# Altium schematic symbol library SCHLIB.SchLib: 2608 symbols (part 12 of 20)
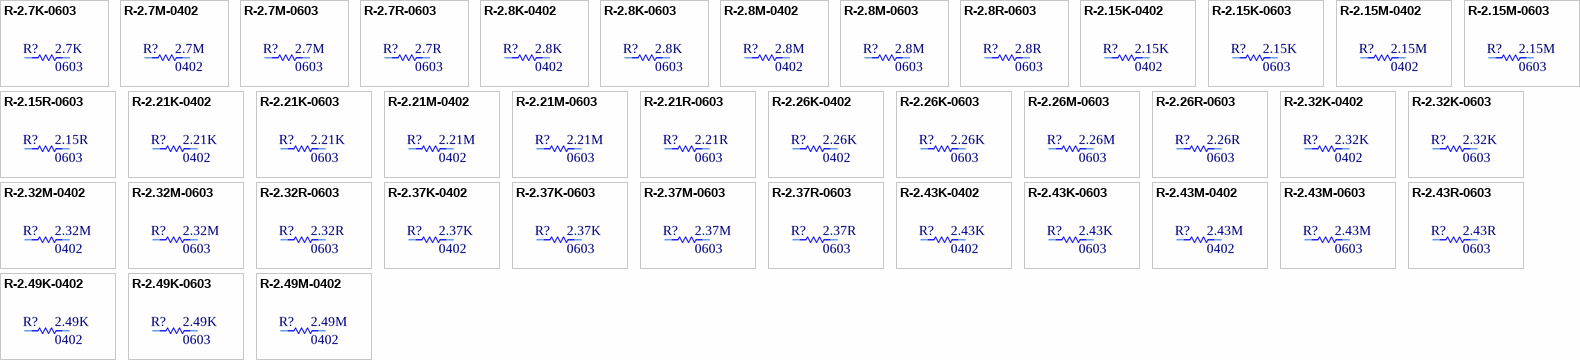
[diagram p94: symbols R-2.7K-0603 to R-2.49M-0402]

## R-2.26K-0603
designator R?, comment Package: 0603  (hidden comment: 2.26K)
RES SMD 2.26K OHM 1% 1/10W 0603; Manufacturer Part Number: CRCW06032K26FKEA; Manufacturer: Vishay Dale; Tolerance: 0.01; Power: 0.1W; Temperature Coefficient: ±100ppm/°C; Object  Type: Part; Design Item ID: R-2.26K-0603; Value: 2.26K; Composition: Thick Film; Features: Automotive AEC-Q200; Operating Temperature: -55°C ~ 155°C; Height - Seated (Max): 0.50mm; Category: Resistor
footprint R0603
pins: 1, 2

## R-2.26M-0603
designator R?, comment Package: 0603  (hidden comment: 2.26M)
RES SMD 2.26M OHM 1% 1/10W 0603; Manufacturer Part Number: CRCW06032M26FKEA; Manufacturer: Vishay Dale; Tolerance: 0.01; Power: 0.1W; Temperature Coefficient: ±100ppm/°C; Object  Type: Part; Design Item ID: R-2.26M-0603; Value: 2.26M; Composition: Thick Film; Features: Automotive AEC-Q200; Operating Temperature: -55°C ~ 155°C; Height - Seated (Max): 0.50mm; Category: Resistor
footprint R0603
pins: 1, 2

## R-2.26R-0603
designator R?, comment Package: 0603  (hidden comment: 2.26R)
RES SMD 2.26 OHM 1% 1/10W 0603; Manufacturer Part Number: CRCW06032R26FKEA; Manufacturer: Vishay Dale; Tolerance: 0.01; Power: 0.1W; Temperature Coefficient: ±100ppm/°C; Object  Type: Part; Design Item ID: R-2.26R-0603; Value: 2.26R; Composition: Thick Film; Features: Automotive AEC-Q200; Operating Temperature: -55°C ~ 155°C; Height - Seated (Max): 0.50mm; Category: Resistor
footprint R0603
pins: 1, 2

## R-2.32K-0402
designator R?, comment Package: 0402  (hidden comment: 2.32K)
RES 2.32K OHM 1% 1/16W 0402; Manufacturer Part Number: RC0402FR-072K32L; Manufacturer: YAGEO; Tolerance: 0.01; Power: 0.063W; Temperature Coefficient: ±100ppm/°C; Object  Type: Part; Design Item ID: R-2.32K-0402; Value: 2.32K; Composition: Thick Film; Features: Moisture Resistant; Operating Temperature: -55°C ~ 155°C; Height - Seated (Max): 0.40mm; Category: Resistor
footprint R0402
pins: 1, 2

## R-2.32K-0603
designator R?, comment Package: 0603  (hidden comment: 2.32K)
RES SMD 2.32K OHM 1% 1/10W 0603; Manufacturer Part Number: CRCW06032K32FKEA; Manufacturer: Vishay Dale; Tolerance: 0.01; Power: 0.1W; Temperature Coefficient: ±100ppm/°C; Object  Type: Part; Design Item ID: R-2.32K-0603; Value: 2.32K; Composition: Thick Film; Features: Automotive AEC-Q200; Operating Temperature: -55°C ~ 155°C; Height - Seated (Max): 0.50mm; Category: Resistor
footprint R0603
pins: 1, 2

## R-2.32M-0402
designator R?, comment Package: 0402  (hidden comment: 2.32M)
RES 2.32M OHM 1% 1/16W 0402; Manufacturer Part Number: RC0402FR-072M32L; Manufacturer: YAGEO; Tolerance: 0.01; Power: 0.063W; Temperature Coefficient: ±100ppm/°C; Object  Type: Part; Design Item ID: R-2.32M-0402; Value: 2.32M; Composition: Thick Film; Features: Moisture Resistant; Operating Temperature: -55°C ~ 155°C; Height - Seated (Max): 0.40mm; Category: Resistor
footprint R0402
pins: 1, 2

## R-2.32M-0603
designator R?, comment Package: 0603  (hidden comment: 2.32M)
RES SMD 2.32M OHM 1% 1/10W 0603; Manufacturer Part Number: CRCW06032M32FKEA; Manufacturer: Vishay Dale; Tolerance: 0.01; Power: 0.1W; Temperature Coefficient: ±100ppm/°C; Object  Type: Part; Design Item ID: R-2.32M-0603; Value: 2.32M; Composition: Thick Film; Features: Automotive AEC-Q200; Operating Temperature: -55°C ~ 155°C; Height - Seated (Max): 0.50mm; Category: Resistor
footprint R0603
pins: 1, 2

## R-2.32R-0603
designator R?, comment Package: 0603  (hidden comment: 2.32R)
RES SMD 2.32 OHM 1% 1/10W 0603; Manufacturer Part Number: CRCW06032R32FKEA; Manufacturer: Vishay Dale; Tolerance: 0.01; Power: 0.1W; Temperature Coefficient: ±100ppm/°C; Object  Type: Part; Design Item ID: R-2.32R-0603; Value: 2.32R; Composition: Thick Film; Features: Automotive AEC-Q200; Operating Temperature: -55°C ~ 155°C; Height - Seated (Max): 0.50mm; Category: Resistor
footprint R0603
pins: 1, 2

## R-2.37K-0402
designator R?, comment Package: 0402  (hidden comment: 2.37K)
RES 2.37K OHM 1% 1/16W 0402; Manufacturer Part Number: RC0402FR-072K37L; Manufacturer: YAGEO; Tolerance: 0.01; Power: 0.063W; Temperature Coefficient: ±100ppm/°C; Object  Type: Part; Design Item ID: R-2.37K-0402; Value: 2.37K; Composition: Thick Film; Features: Moisture Resistant; Operating Temperature: -55°C ~ 155°C; Height - Seated (Max): 0.40mm; Category: Resistor
footprint R0402
pins: 1, 2

## R-2.37K-0603
designator R?, comment Package: 0603  (hidden comment: 2.37K)
RES SMD 2.37K OHM 1% 1/10W 0603; Manufacturer Part Number: CRCW06032K37FKEA; Manufacturer: Vishay Dale; Tolerance: 0.01; Power: 0.1W; Temperature Coefficient: ±100ppm/°C; Object  Type: Part; Design Item ID: R-2.37K-0603; Value: 2.37K; Composition: Thick Film; Features: Automotive AEC-Q200; Operating Temperature: -55°C ~ 155°C; Height - Seated (Max): 0.50mm; Category: Resistor
footprint R0603
pins: 1, 2

## R-2.37M-0603
designator R?, comment Package: 0603  (hidden comment: 2.37M)
RES SMD 2.37M OHM 1% 1/10W 0603; Manufacturer Part Number: CRCW06032M37FKEA; Manufacturer: Vishay Dale; Tolerance: 0.01; Power: 0.1W; Temperature Coefficient: ±100ppm/°C; Object  Type: Part; Design Item ID: R-2.37M-0603; Value: 2.37M; Composition: Thick Film; Features: Automotive AEC-Q200; Operating Temperature: -55°C ~ 155°C; Height - Seated (Max): 0.50mm; Category: Resistor
footprint R0603
pins: 1, 2

## R-2.37R-0603
designator R?, comment Package: 0603  (hidden comment: 2.37R)
RES SMD 2.37 OHM 1% 1/10W 0603; Manufacturer Part Number: CRCW06032R37FKEA; Manufacturer: Vishay Dale; Tolerance: 0.01; Power: 0.1W; Temperature Coefficient: ±100ppm/°C; Object  Type: Part; Design Item ID: R-2.37R-0603; Value: 2.37R; Composition: Thick Film; Features: Automotive AEC-Q200; Operating Temperature: -55°C ~ 155°C; Height - Seated (Max): 0.50mm; Category: Resistor
footprint R0603
pins: 1, 2

## R-2.43K-0402
designator R?, comment Package: 0402  (hidden comment: 2.43K)
RES 2.43K OHM 1% 1/16W 0402; Manufacturer Part Number: RC0402FR-072K43L; Manufacturer: YAGEO; Tolerance: 0.01; Power: 0.063W; Temperature Coefficient: ±100ppm/°C; Object  Type: Part; Design Item ID: R-2.43K-0402; Value: 2.43K; Composition: Thick Film; Features: Moisture Resistant; Operating Temperature: -55°C ~ 155°C; Height - Seated (Max): 0.40mm; Category: Resistor
footprint R0402
pins: 1, 2

## R-2.43K-0603
designator R?, comment Package: 0603  (hidden comment: 2.43K)
RES SMD 2.43K OHM 1% 1/10W 0603; Manufacturer Part Number: CRCW06032K43FKEA; Manufacturer: Vishay Dale; Tolerance: 0.01; Power: 0.1W; Temperature Coefficient: ±100ppm/°C; Object  Type: Part; Design Item ID: R-2.43K-0603; Value: 2.43K; Composition: Thick Film; Features: Automotive AEC-Q200; Operating Temperature: -55°C ~ 155°C; Height - Seated (Max): 0.50mm; Category: Resistor
footprint R0603
pins: 1, 2

## R-2.43M-0402
designator R?, comment Package: 0402  (hidden comment: 2.43M)
RES 2.43M OHM 1% 1/16W 0402; Manufacturer Part Number: RC0402FR-072M43L; Manufacturer: YAGEO; Tolerance: 0.01; Power: 0.063W; Temperature Coefficient: ±100ppm/°C; Object  Type: Part; Design Item ID: R-2.43M-0402; Value: 2.43M; Composition: Thick Film; Features: Moisture Resistant; Operating Temperature: -55°C ~ 155°C; Height - Seated (Max): 0.40mm; Category: Resistor
footprint R0402
pins: 1, 2

## R-2.43M-0603
designator R?, comment Package: 0603  (hidden comment: 2.43M)
RES SMD 2.43M OHM 1% 1/10W 0603; Manufacturer Part Number: CRCW06032M43FKEA; Manufacturer: Vishay Dale; Tolerance: 0.01; Power: 0.1W; Temperature Coefficient: ±100ppm/°C; Object  Type: Part; Design Item ID: R-2.43M-0603; Value: 2.43M; Composition: Thick Film; Features: Automotive AEC-Q200; Operating Temperature: -55°C ~ 155°C; Height - Seated (Max): 0.50mm; Category: Resistor
footprint R0603
pins: 1, 2

## R-2.43R-0603
designator R?, comment Package: 0603  (hidden comment: 2.43R)
RES SMD 2.43 OHM 1% 1/10W 0603; Manufacturer Part Number: CRCW06032R43FKEA; Manufacturer: Vishay Dale; Tolerance: 0.01; Power: 0.1W; Temperature Coefficient: ±100ppm/°C; Object  Type: Part; Design Item ID: R-2.43R-0603; Value: 2.43R; Composition: Thick Film; Features: Automotive AEC-Q200; Operating Temperature: -55°C ~ 155°C; Height - Seated (Max): 0.50mm; Category: Resistor
footprint R0603
pins: 1, 2

## R-2.49K-0402
designator R?, comment Package: 0402  (hidden comment: 2.49K)
RES 2.49K OHM 1% 1/16W 0402; Manufacturer Part Number: RC0402FR-072K49L; Manufacturer: YAGEO; Tolerance: 0.01; Power: 0.063W; Temperature Coefficient: ±100ppm/°C; Object  Type: Part; Design Item ID: R-2.49K-0402; Value: 2.49K; Composition: Thick Film; Features: Moisture Resistant; Operating Temperature: -55°C ~ 155°C; Height - Seated (Max): 0.40mm; Category: Resistor
footprint R0402
pins: 1, 2

## R-2.49K-0603
designator R?, comment Package: 0603  (hidden comment: 2.49K)
RES SMD 2.49K OHM 1% 1/10W 0603; Manufacturer Part Number: CRCW06032K49FKEA; Manufacturer: Vishay Dale; Tolerance: 0.01; Power: 0.1W; Temperature Coefficient: ±100ppm/°C; Object  Type: Part; Design Item ID: R-2.49K-0603; Value: 2.49K; Composition: Thick Film; Features: Automotive AEC-Q200; Operating Temperature: -55°C ~ 155°C; Height - Seated (Max): 0.50mm; Category: Resistor
footprint R0603
pins: 1, 2

## R-2.49M-0402
designator R?, comment Package: 0402  (hidden comment: 2.49M)
RES 2.49M OHM 1% 1/16W 0402; Manufacturer Part Number: RC0402FR-072M49L; Manufacturer: YAGEO; Tolerance: 0.01; Power: 0.063W; Temperature Coefficient: ±100ppm/°C; Object  Type: Part; Design Item ID: R-2.49M-0402; Value: 2.49M; Composition: Thick Film; Features: Moisture Resistant; Operating Temperature: -55°C ~ 155°C; Height - Seated (Max): 0.40mm; Category: Resistor
footprint R0402
pins: 1, 2

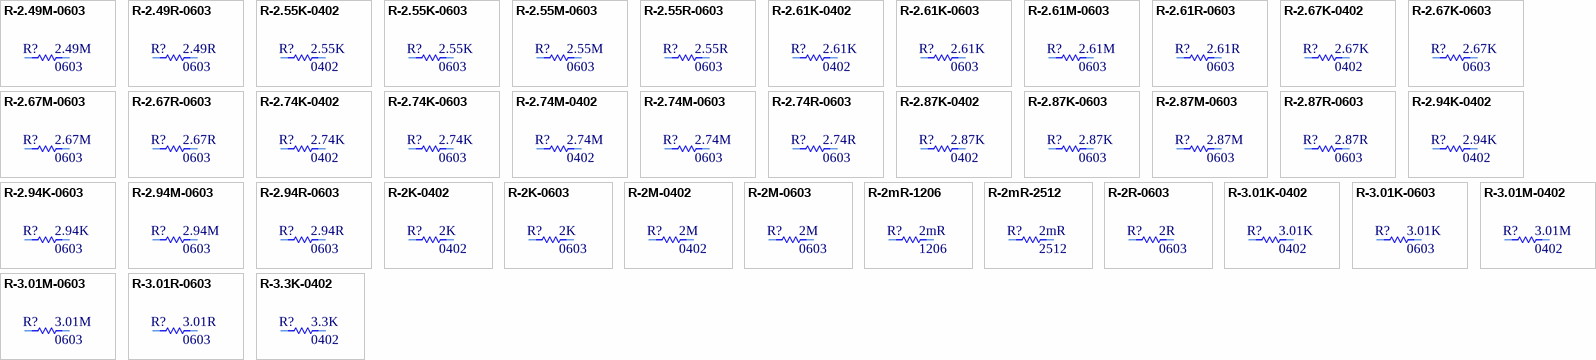
[diagram p49: symbols R-2.49M-0603 to R-3.3K-0402]

## R-2.49M-0603
designator R?, comment Package: 0603  (hidden comment: 2.49M)
RES SMD 2.49M OHM 1% 1/10W 0603; Manufacturer Part Number: CRCW06032M49FKEA; Manufacturer: Vishay Dale; Tolerance: 0.01; Power: 0.1W; Temperature Coefficient: ±100ppm/°C; Object  Type: Part; Design Item ID: R-2.49M-0603; Value: 2.49M; Composition: Thick Film; Features: Automotive AEC-Q200; Operating Temperature: -55°C ~ 155°C; Height - Seated (Max): 0.50mm; Category: Resistor
footprint R0603
pins: 1, 2

## R-2.49R-0603
designator R?, comment Package: 0603  (hidden comment: 2.49R)
RES SMD 2.49 OHM 1% 1/10W 0603; Manufacturer Part Number: CRCW06032R49FKEA; Manufacturer: Vishay Dale; Tolerance: 0.01; Power: 0.1W; Temperature Coefficient: ±100ppm/°C; Object  Type: Part; Design Item ID: R-2.49R-0603; Value: 2.49R; Composition: Thick Film; Features: Automotive AEC-Q200; Operating Temperature: -55°C ~ 155°C; Height - Seated (Max): 0.50mm; Category: Resistor
footprint R0603
pins: 1, 2

## R-2.55K-0402
designator R?, comment Package: 0402  (hidden comment: 2.55K)
RES 2.55K OHM 1% 1/16W 0402; Manufacturer Part Number: RC0402FR-072K55L; Manufacturer: YAGEO; Tolerance: 0.01; Power: 0.063W; Temperature Coefficient: ±100ppm/°C; Object  Type: Part; Design Item ID: R-2.55K-0402; Value: 2.55K; Composition: Thick Film; Features: Moisture Resistant; Operating Temperature: -55°C ~ 155°C; Height - Seated (Max): 0.40mm; Category: Resistor
footprint R0402
pins: 1, 2

## R-2.55K-0603
designator R?, comment Package: 0603  (hidden comment: 2.55K)
RES SMD 2.55K OHM 1% 1/10W 0603; Manufacturer Part Number: CRCW06032K55FKEA; Manufacturer: Vishay Dale; Tolerance: 0.01; Power: 0.1W; Temperature Coefficient: ±100ppm/°C; Object  Type: Part; Design Item ID: R-2.55K-0603; Value: 2.55K; Composition: Thick Film; Features: Automotive AEC-Q200; Operating Temperature: -55°C ~ 155°C; Height - Seated (Max): 0.50mm; Category: Resistor
footprint R0603
pins: 1, 2

## R-2.55M-0603
designator R?, comment Package: 0603  (hidden comment: 2.55M)
RES SMD 2.55M OHM 1% 1/10W 0603; Manufacturer Part Number: CRCW06032M55FKEA; Manufacturer: Vishay Dale; Tolerance: 0.01; Power: 0.1W; Temperature Coefficient: ±100ppm/°C; Object  Type: Part; Design Item ID: R-2.55M-0603; Value: 2.55M; Composition: Thick Film; Features: Automotive AEC-Q200; Operating Temperature: -55°C ~ 155°C; Height - Seated (Max): 0.50mm; Category: Resistor
footprint R0603
pins: 1, 2

## R-2.55R-0603
designator R?, comment Package: 0603  (hidden comment: 2.55R)
RES SMD 2.55 OHM 1% 1/10W 0603; Manufacturer Part Number: CRCW06032R55FKEA; Manufacturer: Vishay Dale; Tolerance: 0.01; Power: 0.1W; Temperature Coefficient: ±100ppm/°C; Object  Type: Part; Design Item ID: R-2.55R-0603; Value: 2.55R; Composition: Thick Film; Features: Automotive AEC-Q200; Operating Temperature: -55°C ~ 155°C; Height - Seated (Max): 0.50mm; Category: Resistor
footprint R0603
pins: 1, 2

## R-2.61K-0402
designator R?, comment Package: 0402  (hidden comment: 2.61K)
RES 2.61K OHM 1% 1/16W 0402; Manufacturer Part Number: RC0402FR-072K61L; Manufacturer: YAGEO; Tolerance: 0.01; Power: 0.063W; Temperature Coefficient: ±100ppm/°C; Object  Type: Part; Design Item ID: R-2.61K-0402; Value: 2.61K; Composition: Thick Film; Features: Moisture Resistant; Operating Temperature: -55°C ~ 155°C; Height - Seated (Max): 0.40mm; Category: Resistor
footprint R0402
pins: 1, 2

## R-2.61K-0603
designator R?, comment Package: 0603  (hidden comment: 2.61K)
RES SMD 2.61K OHM 1% 1/10W 0603; Manufacturer Part Number: CRCW06032K61FKEA; Manufacturer: Vishay Dale; Tolerance: 0.01; Power: 0.1W; Temperature Coefficient: ±100ppm/°C; Object  Type: Part; Design Item ID: R-2.61K-0603; Value: 2.61K; Composition: Thick Film; Features: Automotive AEC-Q200; Operating Temperature: -55°C ~ 155°C; Height - Seated (Max): 0.50mm; Category: Resistor
footprint R0603
pins: 1, 2

## R-2.61M-0603
designator R?, comment Package: 0603  (hidden comment: 2.61M)
RES SMD 2.61M OHM 1% 1/10W 0603; Manufacturer Part Number: CRCW06032M61FKEA; Manufacturer: Vishay Dale; Tolerance: 0.01; Power: 0.1W; Temperature Coefficient: ±100ppm/°C; Object  Type: Part; Design Item ID: R-2.61M-0603; Value: 2.61M; Composition: Thick Film; Features: Automotive AEC-Q200; Operating Temperature: -55°C ~ 155°C; Height - Seated (Max): 0.50mm; Category: Resistor
footprint R0603
pins: 1, 2

## R-2.61R-0603
designator R?, comment Package: 0603  (hidden comment: 2.61R)
RES SMD 2.61 OHM 1% 1/10W 0603; Manufacturer Part Number: CRCW06032R61FKEA; Manufacturer: Vishay Dale; Tolerance: 0.01; Power: 0.1W; Temperature Coefficient: ±100ppm/°C; Object  Type: Part; Design Item ID: R-2.61R-0603; Value: 2.61R; Composition: Thick Film; Features: Automotive AEC-Q200; Operating Temperature: -55°C ~ 155°C; Height - Seated (Max): 0.50mm; Category: Resistor
footprint R0603
pins: 1, 2

## R-2.67K-0402
designator R?, comment Package: 0402  (hidden comment: 2.67K)
RES 2.67K OHM 1% 1/16W 0402; Manufacturer Part Number: RC0402FR-072K67L; Manufacturer: YAGEO; Tolerance: 0.01; Power: 0.063W; Temperature Coefficient: ±100ppm/°C; Object  Type: Part; Design Item ID: R-2.67K-0402; Value: 2.67K; Composition: Thick Film; Features: Moisture Resistant; Operating Temperature: -55°C ~ 155°C; Height - Seated (Max): 0.40mm; Category: Resistor
footprint R0402
pins: 1, 2

## R-2.67K-0603
designator R?, comment Package: 0603  (hidden comment: 2.67K)
RES SMD 2.67K OHM 1% 1/10W 0603; Manufacturer Part Number: CRCW06032K67FKEA; Manufacturer: Vishay Dale; Tolerance: 0.01; Power: 0.1W; Temperature Coefficient: ±100ppm/°C; Object  Type: Part; Design Item ID: R-2.67K-0603; Value: 2.67K; Composition: Thick Film; Features: Automotive AEC-Q200; Operating Temperature: -55°C ~ 155°C; Height - Seated (Max): 0.50mm; Category: Resistor
footprint R0603
pins: 1, 2

## R-2.67M-0603
designator R?, comment Package: 0603  (hidden comment: 2.67M)
RES SMD 2.67M OHM 1% 1/10W 0603; Manufacturer Part Number: CRCW06032M67FKEA; Manufacturer: Vishay Dale; Tolerance: 0.01; Power: 0.1W; Temperature Coefficient: ±100ppm/°C; Object  Type: Part; Design Item ID: R-2.67M-0603; Value: 2.67M; Composition: Thick Film; Features: Automotive AEC-Q200; Operating Temperature: -55°C ~ 155°C; Height - Seated (Max): 0.50mm; Category: Resistor
footprint R0603
pins: 1, 2

## R-2.67R-0603
designator R?, comment Package: 0603  (hidden comment: 2.67R)
RES SMD 2.67 OHM 1% 1/10W 0603; Manufacturer Part Number: CRCW06032R67FKEA; Manufacturer: Vishay Dale; Tolerance: 0.01; Power: 0.1W; Temperature Coefficient: ±100ppm/°C; Object  Type: Part; Design Item ID: R-2.67R-0603; Value: 2.67R; Composition: Thick Film; Features: Automotive AEC-Q200; Operating Temperature: -55°C ~ 155°C; Height - Seated (Max): 0.50mm; Category: Resistor
footprint R0603
pins: 1, 2

## R-2.74K-0402
designator R?, comment Package: 0402  (hidden comment: 2.74K)
RES 2.74K OHM 1% 1/16W 0402; Manufacturer Part Number: RC0402FR-072K74L; Manufacturer: YAGEO; Tolerance: 0.01; Power: 0.063W; Temperature Coefficient: ±100ppm/°C; Object  Type: Part; Design Item ID: R-2.74K-0402; Value: 2.74K; Composition: Thick Film; Features: Moisture Resistant; Operating Temperature: -55°C ~ 155°C; Height - Seated (Max): 0.40mm; Category: Resistor
footprint R0402
pins: 1, 2

## R-2.74K-0603
designator R?, comment Package: 0603  (hidden comment: 2.74K)
RES SMD 2.74K OHM 1% 1/10W 0603; Manufacturer Part Number: CRCW06032K74FKEA; Manufacturer: Vishay Dale; Tolerance: 0.01; Power: 0.1W; Temperature Coefficient: ±100ppm/°C; Object  Type: Part; Design Item ID: R-2.74K-0603; Value: 2.74K; Composition: Thick Film; Features: Automotive AEC-Q200; Operating Temperature: -55°C ~ 155°C; Height - Seated (Max): 0.50mm; Category: Resistor
footprint R0603
pins: 1, 2

## R-2.74M-0402
designator R?, comment Package: 0402  (hidden comment: 2.74M)
RES 2.74M OHM 1% 1/16W 0402; Manufacturer Part Number: RC0402FR-072M74L; Manufacturer: YAGEO; Tolerance: 0.01; Power: 0.063W; Temperature Coefficient: ±100ppm/°C; Object  Type: Part; Design Item ID: R-2.74M-0402; Value: 2.74M; Composition: Thick Film; Features: Moisture Resistant; Operating Temperature: -55°C ~ 155°C; Height - Seated (Max): 0.40mm; Category: Resistor
footprint R0402
pins: 1, 2

## R-2.74M-0603
designator R?, comment Package: 0603  (hidden comment: 2.74M)
RES SMD 2.74M OHM 1% 1/10W 0603; Manufacturer Part Number: CRCW06032M74FKEA; Manufacturer: Vishay Dale; Tolerance: 0.01; Power: 0.1W; Temperature Coefficient: ±100ppm/°C; Object  Type: Part; Design Item ID: R-2.74M-0603; Value: 2.74M; Composition: Thick Film; Features: Automotive AEC-Q200; Operating Temperature: -55°C ~ 155°C; Height - Seated (Max): 0.50mm; Category: Resistor
footprint R0603
pins: 1, 2

## R-2.74R-0603
designator R?, comment Package: 0603  (hidden comment: 2.74R)
RES SMD 2.74 OHM 1% 1/10W 0603; Manufacturer Part Number: CRCW06032R74FKEA; Manufacturer: Vishay Dale; Tolerance: 0.01; Power: 0.1W; Temperature Coefficient: ±100ppm/°C; Object  Type: Part; Design Item ID: R-2.74R-0603; Value: 2.74R; Composition: Thick Film; Features: Automotive AEC-Q200; Operating Temperature: -55°C ~ 155°C; Height - Seated (Max): 0.50mm; Category: Resistor
footprint R0603
pins: 1, 2

## R-2.87K-0402
designator R?, comment Package: 0402  (hidden comment: 2.87K)
RES 2.87K OHM 1% 1/16W 0402; Manufacturer Part Number: RC0402FR-072K87L; Manufacturer: YAGEO; Tolerance: 0.01; Power: 0.063W; Temperature Coefficient: ±100ppm/°C; Object  Type: Part; Design Item ID: R-2.87K-0402; Value: 2.87K; Composition: Thick Film; Features: Moisture Resistant; Operating Temperature: -55°C ~ 155°C; Height - Seated (Max): 0.40mm; Category: Resistor
footprint R0402
pins: 1, 2

## R-2.87K-0603
designator R?, comment Package: 0603  (hidden comment: 2.87K)
RES SMD 2.87K OHM 1% 1/10W 0603; Manufacturer Part Number: CRCW06032K87FKEA; Manufacturer: Vishay Dale; Tolerance: 0.01; Power: 0.1W; Temperature Coefficient: ±100ppm/°C; Object  Type: Part; Design Item ID: R-2.87K-0603; Value: 2.87K; Composition: Thick Film; Features: Automotive AEC-Q200; Operating Temperature: -55°C ~ 155°C; Height - Seated (Max): 0.50mm; Category: Resistor
footprint R0603
pins: 1, 2

## R-2.87M-0603
designator R?, comment Package: 0603  (hidden comment: 2.87M)
RES SMD 2.87M OHM 1% 1/10W 0603; Manufacturer Part Number: CRCW06032M87FKEA; Manufacturer: Vishay Dale; Tolerance: 0.01; Power: 0.1W; Temperature Coefficient: ±100ppm/°C; Object  Type: Part; Design Item ID: R-2.87M-0603; Value: 2.87M; Composition: Thick Film; Features: Automotive AEC-Q200; Operating Temperature: -55°C ~ 155°C; Height - Seated (Max): 0.50mm; Category: Resistor
footprint R0603
pins: 1, 2

## R-2.87R-0603
designator R?, comment Package: 0603  (hidden comment: 2.87R)
RES SMD 2.87 OHM 1% 1/10W 0603; Manufacturer Part Number: CRCW06032R87FKEA; Manufacturer: Vishay Dale; Tolerance: 0.01; Power: 0.1W; Temperature Coefficient: ±100ppm/°C; Object  Type: Part; Design Item ID: R-2.87R-0603; Value: 2.87R; Composition: Thick Film; Features: Automotive AEC-Q200; Operating Temperature: -55°C ~ 155°C; Height - Seated (Max): 0.50mm; Category: Resistor
footprint R0603
pins: 1, 2

## R-2.94K-0402
designator R?, comment Package: 0402  (hidden comment: 2.94K)
RES 2.94K OHM 1% 1/16W 0402; Manufacturer Part Number: RC0402FR-072K94L; Manufacturer: YAGEO; Tolerance: 0.01; Power: 0.063W; Temperature Coefficient: ±100ppm/°C; Object  Type: Part; Design Item ID: R-2.94K-0402; Value: 2.94K; Composition: Thick Film; Features: Moisture Resistant; Operating Temperature: -55°C ~ 155°C; Height - Seated (Max): 0.40mm; Category: Resistor
footprint R0402
pins: 1, 2

## R-2.94K-0603
designator R?, comment Package: 0603  (hidden comment: 2.94K)
RES SMD 2.94K OHM 1% 1/10W 0603; Manufacturer Part Number: CRCW06032K94FKEA; Manufacturer: Vishay Dale; Tolerance: 0.01; Power: 0.1W; Temperature Coefficient: ±100ppm/°C; Object  Type: Part; Design Item ID: R-2.94K-0603; Value: 2.94K; Composition: Thick Film; Features: Automotive AEC-Q200; Operating Temperature: -55°C ~ 155°C; Height - Seated (Max): 0.50mm; Category: Resistor
footprint R0603
pins: 1, 2

## R-2.94M-0603
designator R?, comment Package: 0603  (hidden comment: 2.94M)
RES SMD 2.94M OHM 1% 1/10W 0603; Manufacturer Part Number: CRCW06032M94FKEA; Manufacturer: Vishay Dale; Tolerance: 0.01; Power: 0.1W; Temperature Coefficient: ±100ppm/°C; Object  Type: Part; Design Item ID: R-2.94M-0603; Value: 2.94M; Composition: Thick Film; Features: Automotive AEC-Q200; Operating Temperature: -55°C ~ 155°C; Height - Seated (Max): 0.50mm; Category: Resistor
footprint R0603
pins: 1, 2

## R-2.94R-0603
designator R?, comment Package: 0603  (hidden comment: 2.94R)
RES SMD 2.94 OHM 1% 1/10W 0603; Manufacturer Part Number: CRCW06032R94FKEA; Manufacturer: Vishay Dale; Tolerance: 0.01; Power: 0.1W; Temperature Coefficient: ±100ppm/°C; Object  Type: Part; Design Item ID: R-2.94R-0603; Value: 2.94R; Composition: Thick Film; Features: Automotive AEC-Q200; Operating Temperature: -55°C ~ 155°C; Height - Seated (Max): 0.50mm; Category: Resistor
footprint R0603
pins: 1, 2

## R-2K-0402
designator R?, comment Package: 0402  (hidden comment: 2K)
RES 2K OHM 1% 1/16W 0402; Manufacturer Part Number: RC0402FR-072KL; Manufacturer: YAGEO; Tolerance: 0.01; Power: 0.063W; Temperature Coefficient: ±100ppm/°C; Object  Type: Part; Design Item ID: R-2K-0402; Value: 2K; Composition: Thick Film; Features: Moisture Resistant; Operating Temperature: -55°C ~ 155°C; Height - Seated (Max): 0.40mm; Category: Resistor
footprint R0402
pins: 1, 2

## R-2K-0603
designator R?, comment Package: 0603  (hidden comment: 2K)
RES SMD 2K OHM 1% 1/10W 0603; Manufacturer Part Number: CRCW06032K00FKEA; Manufacturer: Vishay Dale; Tolerance: 0.01; Power: 0.1W; Temperature Coefficient: ±100ppm/°C; Object  Type: Part; Design Item ID: R-2K-0603; Value: 2K; Composition: Thick Film; Features: Automotive AEC-Q200; Operating Temperature: -55°C ~ 155°C; Height - Seated (Max): 0.50mm; Category: Resistor
footprint R0603
pins: 1, 2

## R-2M-0402
designator R?, comment Package: 0402  (hidden comment: 2M)
RES 2M OHM 1% 1/16W 0402; Manufacturer Part Number: RC0402FR-072ML; Manufacturer: YAGEO; Tolerance: 0.01; Power: 0.063W; Temperature Coefficient: ±100ppm/°C; Object  Type: Part; Design Item ID: R-2M-0402; Value: 2M; Composition: Thick Film; Features: Moisture Resistant; Operating Temperature: -55°C ~ 155°C; Height - Seated (Max): 0.40mm; Category: Resistor
footprint R0402
pins: 1, 2

## R-2M-0603
designator R?, comment Package: 0603  (hidden comment: 2M)
RES SMD 2M OHM 1% 1/10W 0603; Manufacturer Part Number: CRCW06032M00FKEA; Manufacturer: Vishay Dale; Tolerance: 0.01; Power: 0.1W; Temperature Coefficient: ±100ppm/°C; Object  Type: Part; Design Item ID: R-2M-0603; Value: 2M; Composition: Thick Film; Features: Automotive AEC-Q200; Operating Temperature: -55°C ~ 155°C; Height - Seated (Max): 0.50mm; Category: Resistor
footprint R0603
pins: 1, 2

## R-2mR-1206
designator R?, comment Package: 1206  (hidden comment: 2mR)
RES 0.002 OHM 1% 1/4W 1206; Manufacturer Part Number: WSL12062L000FEA; Manufacturer: Vishay Dale; Tolerance: 0.01; Power: 0.25W; Temperature Coefficient: ±275ppm/°C; Object  Type: Part; Design Item ID: R-2mR-1206; Value: 2mR; Composition: Metal Element; Features: Anti-Sulfur, Automotive AEC-Q200, Current Sense, Moisture Resistant, Pulse Withstanding; Operating Temperature: -65°C ~ 170°C; Height - Seated (Max): 0.89mm; Category: Resistor
footprint R1206
pins: 1, 2

## R-2mR-2512
designator R?, comment Package: 2512  (hidden comment: 2mR)
RES 0.002 OHM 1% 1W 2512; Manufacturer Part Number: WSL25122L000FEA; Manufacturer: Vishay Dale; Tolerance: 0.01; Temperature Coefficient: ±275ppm/°C; Object  Type: Part; Design Item ID: R-2mR-2512; Value: 2mR; Power: 1W; Composition: Metal Element; Features: Anti-Sulfur, Automotive AEC-Q200, Current Sense, Moisture Resistant, Pulse Withstanding; Operating Temperature: -65°C ~ 170°C; Height - Seated (Max): 0.89mm; Category: Resistor
footprint R2512
pins: 1, 2

## R-2R-0603
designator R?, comment Package: 0603  (hidden comment: 2R)
RES SMD 2 OHM 1% 1/10W 0603; Manufacturer Part Number: CRCW06032R00FKEA; Manufacturer: Vishay Dale; Tolerance: 0.01; Power: 0.1W; Temperature Coefficient: ±100ppm/°C; Object  Type: Part; Design Item ID: R-2R-0603; Value: 2R; Composition: Thick Film; Features: Automotive AEC-Q200; Operating Temperature: -55°C ~ 155°C; Height - Seated (Max): 0.50mm; Category: Resistor
footprint R0603
pins: 1, 2

## R-3.01K-0402
designator R?, comment Package: 0402  (hidden comment: 3.01K)
RES 3.01K OHM 1% 1/16W 0402; Manufacturer Part Number: RC0402FR-073K01L; Manufacturer: YAGEO; Tolerance: 0.01; Power: 0.063W; Temperature Coefficient: ±100ppm/°C; Object  Type: Part; Design Item ID: R-3.01K-0402; Value: 3.01K; Composition: Thick Film; Features: Moisture Resistant; Operating Temperature: -55°C ~ 155°C; Height - Seated (Max): 0.40mm; Category: Resistor
footprint R0402
pins: 1, 2

## R-3.01K-0603
designator R?, comment Package: 0603  (hidden comment: 3.01K)
RES SMD 3.01K OHM 1% 1/10W 0603; Manufacturer Part Number: CRCW06033K01FKEA; Manufacturer: Vishay Dale; Tolerance: 0.01; Power: 0.1W; Temperature Coefficient: ±100ppm/°C; Object  Type: Part; Design Item ID: R-3.01K-0603; Value: 3.01K; Composition: Thick Film; Features: Automotive AEC-Q200; Operating Temperature: -55°C ~ 155°C; Height - Seated (Max): 0.50mm; Category: Resistor
footprint R0603
pins: 1, 2

## R-3.01M-0402
designator R?, comment Package: 0402  (hidden comment: 3.01M)
RES 3.01M OHM 1% 1/16W 0402; Manufacturer Part Number: RC0402FR-073M01L; Manufacturer: YAGEO; Tolerance: 0.01; Power: 0.063W; Temperature Coefficient: ±100ppm/°C; Object  Type: Part; Design Item ID: R-3.01M-0402; Value: 3.01M; Composition: Thick Film; Features: Moisture Resistant; Operating Temperature: -55°C ~ 155°C; Height - Seated (Max): 0.40mm; Category: Resistor
footprint R0402
pins: 1, 2

## R-3.01M-0603
designator R?, comment Package: 0603  (hidden comment: 3.01M)
RES SMD 3.01M OHM 1% 1/10W 0603; Manufacturer Part Number: CRCW06033M01FKEA; Manufacturer: Vishay Dale; Tolerance: 0.01; Power: 0.1W; Temperature Coefficient: ±100ppm/°C; Object  Type: Part; Design Item ID: R-3.01M-0603; Value: 3.01M; Composition: Thick Film; Features: Automotive AEC-Q200; Operating Temperature: -55°C ~ 155°C; Height - Seated (Max): 0.50mm; Category: Resistor
footprint R0603
pins: 1, 2

## R-3.01R-0603
designator R?, comment Package: 0603  (hidden comment: 3.01R)
RES SMD 3.01 OHM 1% 1/10W 0603; Manufacturer Part Number: CRCW06033R01FKEA; Manufacturer: Vishay Dale; Tolerance: 0.01; Power: 0.1W; Temperature Coefficient: ±100ppm/°C; Object  Type: Part; Design Item ID: R-3.01R-0603; Value: 3.01R; Composition: Thick Film; Features: Automotive AEC-Q200; Operating Temperature: -55°C ~ 155°C; Height - Seated (Max): 0.50mm; Category: Resistor
footprint R0603
pins: 1, 2

## R-3.3K-0402
designator R?, comment Package: 0402  (hidden comment: 3.3K)
RES 3.3K OHM 1% 1/16W 0402; Manufacturer Part Number: RC0402FR-073K3L; Manufacturer: YAGEO; Tolerance: 0.01; Power: 0.063W; Temperature Coefficient: ±100ppm/°C; Object  Type: Part; Design Item ID: R-3.3K-0402; Value: 3.3K; Composition: Thick Film; Features: Moisture Resistant; Operating Temperature: -55°C ~ 155°C; Height - Seated (Max): 0.40mm; Category: Resistor
footprint R0402
pins: 1, 2

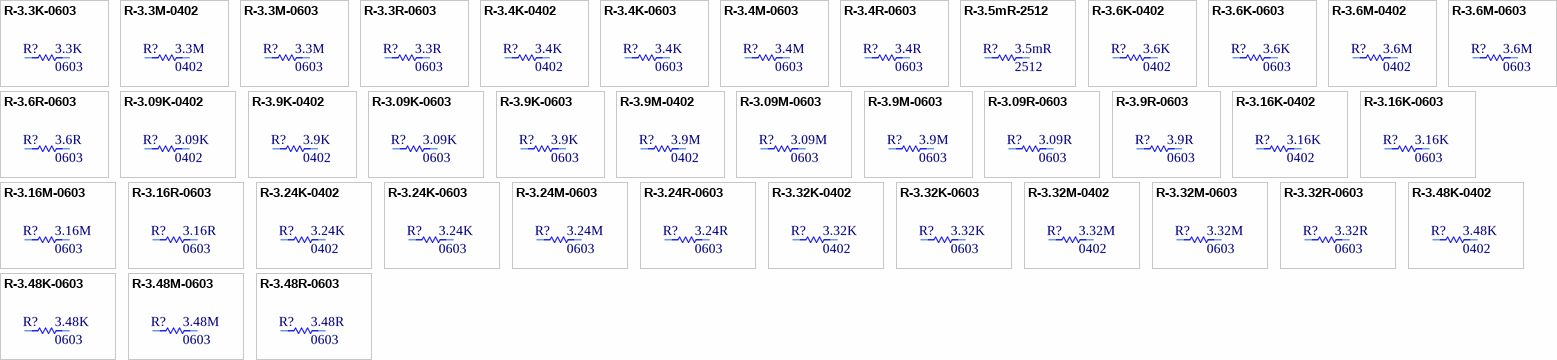
[diagram p50: symbols R-3.3K-0603 to R-3.48R-0603]

## R-3.3K-0603
designator R?, comment Package: 0603  (hidden comment: 3.3K)
RES SMD 3.3K OHM 1% 1/10W 0603; Manufacturer Part Number: CRCW06033K30FKEA; Manufacturer: Vishay Dale; Tolerance: 0.01; Power: 0.1W; Temperature Coefficient: ±100ppm/°C; Object  Type: Part; Design Item ID: R-3.3K-0603; Value: 3.3K; Composition: Thick Film; Features: Automotive AEC-Q200; Operating Temperature: -55°C ~ 155°C; Height - Seated (Max): 0.50mm; Category: Resistor
footprint R0603
pins: 1, 2

## R-3.3M-0402
designator R?, comment Package: 0402  (hidden comment: 3.3M)
RES 3.3M OHM 1% 1/16W 0402; Manufacturer Part Number: RC0402FR-073M3L; Manufacturer: YAGEO; Tolerance: 0.01; Power: 0.063W; Temperature Coefficient: ±100ppm/°C; Object  Type: Part; Design Item ID: R-3.3M-0402; Value: 3.3M; Composition: Thick Film; Features: Moisture Resistant; Operating Temperature: -55°C ~ 155°C; Height - Seated (Max): 0.40mm; Category: Resistor
footprint R0402
pins: 1, 2

## R-3.3M-0603
designator R?, comment Package: 0603  (hidden comment: 3.3M)
RES SMD 3.3M OHM 1% 1/10W 0603; Manufacturer Part Number: CRCW06033M30FKEA; Manufacturer: Vishay Dale; Tolerance: 0.01; Power: 0.1W; Temperature Coefficient: ±100ppm/°C; Object  Type: Part; Design Item ID: R-3.3M-0603; Value: 3.3M; Composition: Thick Film; Features: Automotive AEC-Q200; Operating Temperature: -55°C ~ 155°C; Height - Seated (Max): 0.50mm; Category: Resistor
footprint R0603
pins: 1, 2

## R-3.3R-0603
designator R?, comment Package: 0603  (hidden comment: 3.3R)
RES SMD 3.3 OHM 1% 1/10W 0603; Manufacturer Part Number: CRCW06033R30FKEA; Manufacturer: Vishay Dale; Tolerance: 0.01; Power: 0.1W; Temperature Coefficient: ±100ppm/°C; Object  Type: Part; Design Item ID: R-3.3R-0603; Value: 3.3R; Composition: Thick Film; Features: Automotive AEC-Q200; Operating Temperature: -55°C ~ 155°C; Height - Seated (Max): 0.50mm; Category: Resistor
footprint R0603
pins: 1, 2

## R-3.4K-0402
designator R?, comment Package: 0402  (hidden comment: 3.4K)
RES 3.4K OHM 1% 1/16W 0402; Manufacturer Part Number: RC0402FR-073K4L; Manufacturer: YAGEO; Tolerance: 0.01; Power: 0.063W; Temperature Coefficient: ±100ppm/°C; Object  Type: Part; Design Item ID: R-3.4K-0402; Value: 3.4K; Composition: Thick Film; Features: Moisture Resistant; Operating Temperature: -55°C ~ 155°C; Height - Seated (Max): 0.40mm; Category: Resistor
footprint R0402
pins: 1, 2

## R-3.4K-0603
designator R?, comment Package: 0603  (hidden comment: 3.4K)
RES SMD 3.4K OHM 1% 1/10W 0603; Manufacturer Part Number: CRCW06033K40FKEA; Manufacturer: Vishay Dale; Tolerance: 0.01; Power: 0.1W; Temperature Coefficient: ±100ppm/°C; Object  Type: Part; Design Item ID: R-3.4K-0603; Value: 3.4K; Composition: Thick Film; Features: Automotive AEC-Q200; Operating Temperature: -55°C ~ 155°C; Height - Seated (Max): 0.50mm; Category: Resistor
footprint R0603
pins: 1, 2

## R-3.4M-0603
designator R?, comment Package: 0603  (hidden comment: 3.4M)
RES SMD 3.4M OHM 1% 1/10W 0603; Manufacturer Part Number: CRCW06033M40FKEA; Manufacturer: Vishay Dale; Tolerance: 0.01; Power: 0.1W; Temperature Coefficient: ±100ppm/°C; Object  Type: Part; Design Item ID: R-3.4M-0603; Value: 3.4M; Composition: Thick Film; Features: Automotive AEC-Q200; Operating Temperature: -55°C ~ 155°C; Height - Seated (Max): 0.50mm; Category: Resistor
footprint R0603
pins: 1, 2

## R-3.4R-0603
designator R?, comment Package: 0603  (hidden comment: 3.4R)
RES SMD 3.4 OHM 1% 1/10W 0603; Manufacturer Part Number: CRCW06033R40FKEA; Manufacturer: Vishay Dale; Tolerance: 0.01; Power: 0.1W; Temperature Coefficient: ±100ppm/°C; Object  Type: Part; Design Item ID: R-3.4R-0603; Value: 3.4R; Composition: Thick Film; Features: Automotive AEC-Q200; Operating Temperature: -55°C ~ 155°C; Height - Seated (Max): 0.50mm; Category: Resistor
footprint R0603
pins: 1, 2

## R-3.5mR-2512
designator R?, comment Package: 2512  (hidden comment: 3.5mR)
RES 0.0035 OHM 1% 1W 2512; Manufacturer Part Number: WSL25123L500FEA; Manufacturer: Vishay Dale; Tolerance: 0.01; Temperature Coefficient: ±150ppm/°C; Object  Type: Part; Design Item ID: R-3.5mR-2512; Value: 3.5mR; Power: 1W; Composition: Metal Element; Features: Anti-Sulfur, Automotive AEC-Q200, Current Sense, Moisture Resistant, Pulse Withstanding; Operating Temperature: -65°C ~ 170°C; Height - Seated (Max): 0.89mm; Category: Resistor
footprint R2512
pins: 1, 2

## R-3.6K-0402
designator R?, comment Package: 0402  (hidden comment: 3.6K)
RES 3.6K OHM 1% 1/16W 0402; Manufacturer Part Number: RC0402FR-073K6L; Manufacturer: YAGEO; Tolerance: 0.01; Power: 0.063W; Temperature Coefficient: ±100ppm/°C; Object  Type: Part; Design Item ID: R-3.6K-0402; Value: 3.6K; Composition: Thick Film; Features: Moisture Resistant; Operating Temperature: -55°C ~ 155°C; Height - Seated (Max): 0.40mm; Category: Resistor
footprint R0402
pins: 1, 2

## R-3.6K-0603
designator R?, comment Package: 0603  (hidden comment: 3.6K)
RES SMD 3.6K OHM 1% 1/10W 0603; Manufacturer Part Number: CRCW06033K60FKEA; Manufacturer: Vishay Dale; Tolerance: 0.01; Power: 0.1W; Temperature Coefficient: ±100ppm/°C; Object  Type: Part; Design Item ID: R-3.6K-0603; Value: 3.6K; Composition: Thick Film; Features: Automotive AEC-Q200; Operating Temperature: -55°C ~ 155°C; Height - Seated (Max): 0.50mm; Category: Resistor
footprint R0603
pins: 1, 2

## R-3.6M-0402
designator R?, comment Package: 0402  (hidden comment: 3.6M)
RES 3.6M OHM 1% 1/16W 0402; Manufacturer Part Number: RC0402FR-073M6L; Manufacturer: YAGEO; Tolerance: 0.01; Power: 0.063W; Temperature Coefficient: ±100ppm/°C; Object  Type: Part; Design Item ID: R-3.6M-0402; Value: 3.6M; Composition: Thick Film; Features: Moisture Resistant; Operating Temperature: -55°C ~ 155°C; Height - Seated (Max): 0.40mm; Category: Resistor
footprint R0402
pins: 1, 2

## R-3.6M-0603
designator R?, comment Package: 0603  (hidden comment: 3.6M)
RES SMD 3.6M OHM 1% 1/10W 0603; Manufacturer Part Number: CRCW06033M60FKEA; Manufacturer: Vishay Dale; Tolerance: 0.01; Power: 0.1W; Temperature Coefficient: ±100ppm/°C; Object  Type: Part; Design Item ID: R-3.6M-0603; Value: 3.6M; Composition: Thick Film; Features: Automotive AEC-Q200; Operating Temperature: -55°C ~ 155°C; Height - Seated (Max): 0.50mm; Category: Resistor
footprint R0603
pins: 1, 2

## R-3.6R-0603
designator R?, comment Package: 0603  (hidden comment: 3.6R)
RES SMD 3.6 OHM 1% 1/10W 0603; Manufacturer Part Number: CRCW06033R60FKEA; Manufacturer: Vishay Dale; Tolerance: 0.01; Power: 0.1W; Temperature Coefficient: ±100ppm/°C; Object  Type: Part; Design Item ID: R-3.6R-0603; Value: 3.6R; Composition: Thick Film; Features: Automotive AEC-Q200; Operating Temperature: -55°C ~ 155°C; Height - Seated (Max): 0.50mm; Category: Resistor
footprint R0603
pins: 1, 2

## R-3.09K-0402
designator R?, comment Package: 0402  (hidden comment: 3.09K)
RES 3.09K OHM 1% 1/16W 0402; Manufacturer Part Number: RC0402FR-073K09L; Manufacturer: YAGEO; Tolerance: 0.01; Power: 0.063W; Temperature Coefficient: ±100ppm/°C; Object  Type: Part; Design Item ID: R-3.09K-0402; Value: 3.09K; Composition: Thick Film; Features: Moisture Resistant; Operating Temperature: -55°C ~ 155°C; Height - Seated (Max): 0.40mm; Category: Resistor
footprint R0402
pins: 1, 2

## R-3.9K-0402
designator R?, comment Package: 0402  (hidden comment: 3.9K)
RES 3.9K OHM 1% 1/16W 0402; Manufacturer Part Number: RC0402FR-073K9L; Manufacturer: YAGEO; Tolerance: 0.01; Power: 0.063W; Temperature Coefficient: ±100ppm/°C; Object  Type: Part; Design Item ID: R-3.9K-0402; Value: 3.9K; Composition: Thick Film; Features: Moisture Resistant; Operating Temperature: -55°C ~ 155°C; Height - Seated (Max): 0.40mm; Category: Resistor
footprint R0402
pins: 1, 2

## R-3.09K-0603
designator R?, comment Package: 0603  (hidden comment: 3.09K)
RES SMD 3.09K OHM 1% 1/10W 0603; Manufacturer Part Number: CRCW06033K09FKEA; Manufacturer: Vishay Dale; Tolerance: 0.01; Power: 0.1W; Temperature Coefficient: ±100ppm/°C; Object  Type: Part; Design Item ID: R-3.09K-0603; Value: 3.09K; Composition: Thick Film; Features: Automotive AEC-Q200; Operating Temperature: -55°C ~ 155°C; Height - Seated (Max): 0.50mm; Category: Resistor
footprint R0603
pins: 1, 2

## R-3.9K-0603
designator R?, comment Package: 0603  (hidden comment: 3.9K)
RES SMD 3.9K OHM 1% 1/10W 0603; Manufacturer Part Number: CRCW06033K90FKEA; Manufacturer: Vishay Dale; Tolerance: 0.01; Power: 0.1W; Temperature Coefficient: ±100ppm/°C; Object  Type: Part; Design Item ID: R-3.9K-0603; Value: 3.9K; Composition: Thick Film; Features: Automotive AEC-Q200; Operating Temperature: -55°C ~ 155°C; Height - Seated (Max): 0.50mm; Category: Resistor
footprint R0603
pins: 1, 2

## R-3.9M-0402
designator R?, comment Package: 0402  (hidden comment: 3.9M)
RES 3.9M OHM 1% 1/16W 0402; Manufacturer Part Number: RC0402FR-073M9L; Manufacturer: YAGEO; Tolerance: 0.01; Power: 0.063W; Temperature Coefficient: ±100ppm/°C; Object  Type: Part; Design Item ID: R-3.9M-0402; Value: 3.9M; Composition: Thick Film; Features: Moisture Resistant; Operating Temperature: -55°C ~ 155°C; Height - Seated (Max): 0.40mm; Category: Resistor
footprint R0402
pins: 1, 2

## R-3.09M-0603
designator R?, comment Package: 0603  (hidden comment: 3.09M)
RES SMD 3.09M OHM 1% 1/10W 0603; Manufacturer Part Number: CRCW06033M09FKEA; Manufacturer: Vishay Dale; Tolerance: 0.01; Power: 0.1W; Temperature Coefficient: ±100ppm/°C; Object  Type: Part; Design Item ID: R-3.09M-0603; Value: 3.09M; Composition: Thick Film; Features: Automotive AEC-Q200; Operating Temperature: -55°C ~ 155°C; Height - Seated (Max): 0.50mm; Category: Resistor
footprint R0603
pins: 1, 2

## R-3.9M-0603
designator R?, comment Package: 0603  (hidden comment: 3.9M)
RES SMD 3.9M OHM 1% 1/10W 0603; Manufacturer Part Number: CRCW06033M90FKEA; Manufacturer: Vishay Dale; Tolerance: 0.01; Power: 0.1W; Temperature Coefficient: ±100ppm/°C; Object  Type: Part; Design Item ID: R-3.9M-0603; Value: 3.9M; Composition: Thick Film; Features: Automotive AEC-Q200; Operating Temperature: -55°C ~ 155°C; Height - Seated (Max): 0.50mm; Category: Resistor
footprint R0603
pins: 1, 2

## R-3.09R-0603
designator R?, comment Package: 0603  (hidden comment: 3.09R)
RES SMD 3.09 OHM 1% 1/10W 0603; Manufacturer Part Number: CRCW06033R09FKEA; Manufacturer: Vishay Dale; Tolerance: 0.01; Power: 0.1W; Temperature Coefficient: ±100ppm/°C; Object  Type: Part; Design Item ID: R-3.09R-0603; Value: 3.09R; Composition: Thick Film; Features: Automotive AEC-Q200; Operating Temperature: -55°C ~ 155°C; Height - Seated (Max): 0.50mm; Category: Resistor
footprint R0603
pins: 1, 2

## R-3.9R-0603
designator R?, comment Package: 0603  (hidden comment: 3.9R)